# Altium schematic symbol library lib_datalogger.SchLib: 1246 symbols (part 11 of 16)
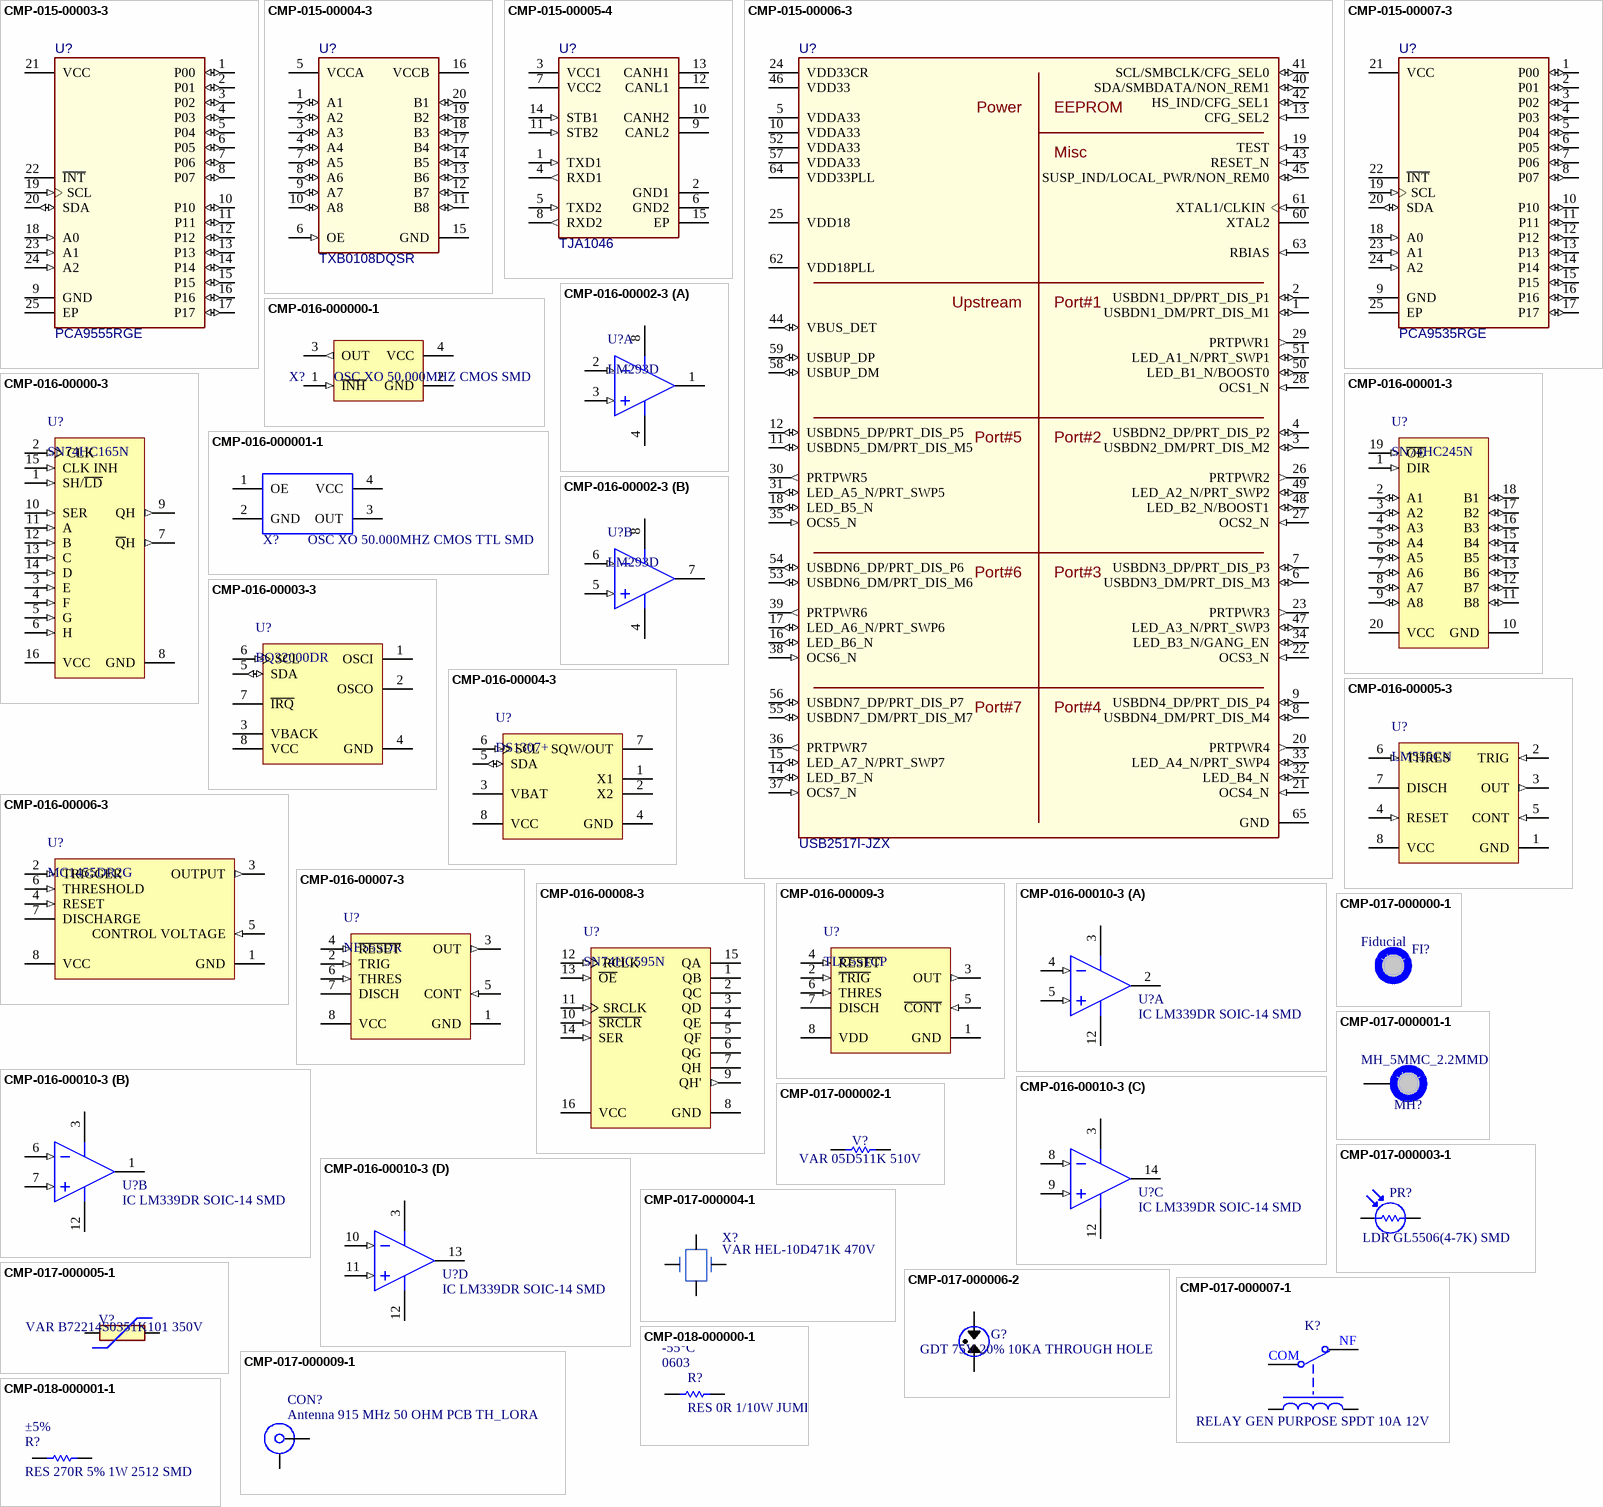
[diagram p53: symbols CMP-015-00003-3 to CMP-018-000001-1]

## CMP-015-00006-3
designator U?, comment USB2517I-JZX
Industrial Temperature Rated USB 2.0 Hi-Speed 7-Port Hub Controller, 3.3 V, -40 to 85 degC, 64-Pin QFN, RoHS, Tube; Case/Package: 64-VFQFNExposedPad; Pins: 65; Mounting Technology: SurfaceMount
footprint MCHP-QFN-64-4700X4700TP (QFN, 64-Leads, Body 9.1x9.1mm, Pitch 0.5mm, Thermal Pad 4.7x4.7mm)
footprint MCHP-QFN-64-4700X4700TP (QFN, 64-Leads, Body 9.1x9.1mm, Pitch 0.5mm, Thermal Pad 4.7x4.7mm)
pins: 1 USBDN1_DM/PRT_DIS_M1 (io), 2 USBDN1_DP/PRT_DIS_P1 (io), 3 USBDN2_DM/PRT_DIS_M2 (io), 4 USBDN2_DP/PRT_DIS_P2 (io), 5 VDDA33 (power) ""VDD Analog I/O.+3.3V Filtered analog PHY power which is shared between", 6 USBDN3_DM/PRT_DIS_M3 (io), 7 USBDN3_DP/PRT_DIS_P3 (io), 8 USBDN4_DM/PRT_DIS_M4 (io), 9 USBDN4_DP/PRT_DIS_P4 (io), 10 VDDA33 (power) ""VDD Analog I/O.+3.3V Filtered analog PHY power which is shared between", 11 USBDN5_DM/PRT_DIS_M5 (io), 12 USBDN5_DP/PRT_DIS_P5 (io), 13 CFG_SEL2 (in) "Configuration Programming Select", 14 LED_B7_N (io) "Enhanced Indicator LED for ports 7", 15 LED_A7_N/PRT_SWP7 (io), 16 LED_B6_N (io) "Enhanced Indicator LED for ports 6", 17 LED_A6_N/PRT_SWP6 (io), 18 LED_B5_N (io) "Enhanced Indicator LED for ports 5", 19 TEST (in) "TEST pin", 20 PRTPWR4 (out) "USB Power Enable", 21 OCS4_N (in) "Over-current Sense", 22 OCS3_N (in) "Over-current Sense", 23 PRTPWR3 (out) "USB Power Enable", 24 VDD33CR (power) ""VDDIO/VDD 3.3 Core Regulator Reference.+3.3V power supply for the Digital I/O. If the internal core", 25 VDD18 (power) ""VDD Core.+1.8V core power. This pin must have a 1.0uF (or greater) +/-20%", 26 PRTPWR2 (out) "USB Power Enable", 27 OCS2_N (in) "Over-current Sense", 28 OCS1_N (in) "Over-current Sense", 29 PRTPWR1 (out) "USB Power Enable", 30 PRTPWR5 (out) "USB Power Enable", 31 LED_A5_N/PRT_SWP5 (io), 32 LED_B4_N (io) "Enhanced Indicator LED for ports 4", 33 LED_A4_N/PRT_SWP4 (io), 34 LED_B3_N/GANG_EN (io), 35 OCS5_N (in) "Over-current Sense", 36 PRTPWR7 (out) "USB Power Enable", 37 OCS7_N (in) "Over-current Sense", 38 OCS6_N (in) "Over-current Sense", 39 PRTPWR6 (out) "USB Power Enable", 40 SDA/SMBDATA/NON_REM1 (io), 41 SCL/SMBCLK/CFG_SEL0 (io), 42 HS_IND/CFG_SEL1 (io), 43 RESET_N (in) "RESET Input", 44 VBUS_DET (io) "Detect Upstream VBUS Power", 45 SUSP_IND/LOCAL_PWR/NON_REM0 (io), 46 VDD33 (power) "VDD I/O.+3.3V Digital I/O power", 47 LED_A3_N/PRT_SWP3 (io), 48 LED_B2_N/BOOST1 (io), 49 LED_A2_N/PRT_SWP2 (io), 50 LED_B1_N/BOOST0 (io), 51 LED_A1_N/PRT_SWP1 (io), 52 VDDA33 (power) ""VDD Analog I/O.+3.3V Filtered analog PHY power which is shared between", 53 USBDN6_DM/PRT_DIS_M6 (io), 54 USBDN6_DP/PRT_DIS_P6 (io), 55 USBDN7_DM/PRT_DIS_M7 (io), 56 USBDN7_DP/PRT_DIS_P7 (io), 57 VDDA33 (power) ""VDD Analog I/O.+3.3V Filtered analog PHY power which is shared between", 58 USBUP_DM (io) "USB Bus Data", 59 USBUP_DP (io) "USB Bus Data", 60 XTAL2 "Crystal Output", 61 XTAL1/CLKIN (in) "Crystal Input/External Clock Input", 62 VDD18PLL (power) ""VDD PLL.+1.8V Filtered analog power for internal PLL. This pin must have", 63 RBIAS (in) "USB Transceiver Bias", 64 VDD33PLL (power) "VDD 3.3 PLL Regulator Reference.+3.3V power supply for the Digital I/O. If the internal PLL 1.8V regulator is enabled, then this pin acts as the regulator input.", 65 GND (power) "Ground"
text: Power; EEPROM; Misc; Upstream; Port#1; Port#5; Port#2; Port#6; Port#3; Port#7; Port#4

## CMP-015-00007-3
designator U?, comment PCA9535RGE
Remote 16-Bit I2C and SMBus I/O Expander with Interrupt Output and Configuration Registers, 2.3 to 5.5 V, -40 to 85 degC, 24-pin VQFN (RGE), Green (RoHS & no Sb/Br); Pins: 25; ComponentLink1Description: Datasheet; ComponentLink2Description: Package Specification; Mounting Technology: Surface Mount; ComponentLink2URL: http://www.ti.com/litv/pdf/mpds211a; ComponentLink1URL: http://www.ti.com/general/docs/lit/getliterature.tsp?genericPartNumber=PCA9535&fileType=pdf
footprint RGE0024C (QFN, 24-Leads, Body 4x4mm, Pitch 0.5mm, Thermal Pad 2.1x2.1mm)
footprint RGE0024C (QFN, 24-Leads, Body 4x4mm, Pitch 0.5mm, Thermal Pad 2.1x2.1mm)
pins: 1 P00 (io) "P-port input/output. Push-pull design structure.", 2 P01 (io) "P-port input/output. Push-pull design structure.", 3 P02 (io) "P-port input/output. Push-pull design structure.", 4 P03 (io) "P-port input/output. Push-pull design structure.", 5 P04 (io) "P-port input/output. Push-pull design structure.", 6 P05 (io) "P-port input/output. Push-pull design structure.", 7 P06 (io) "P-port input/output. Push-pull design structure.", 8 P07 (io) "P-port input/output. Push-pull design structure.", 9 GND (power) "Ground", 10 P10 (io) "P-port input/output. Push-pull design structure.", 11 P11 (io) "P-port input/output. Push-pull design structure.", 12 P12 (io) "P-port input/output. Push-pull design structure.", 13 P13 (io) "P-port input/output. Push-pull design structure.", 14 P14 (io) "P-port input/output. Push-pull design structure.", 15 P15 (io) "P-port input/output. Push-pull design structure.", 16 P16 (io) "P-port input/output. Push-pull design structure.", 17 P17 (io) "P-port input/output. Push-pull design structure.", 18 A0 (in) "Address input 0. Connect directly to VCC or ground.", 19 SCL (in) "Serial clock bus. Connect to VCC through a pullup resistor.", 20 SDA (io) "Serial data bus. Connect to VCC through a pullup resistor.", 21 VCC (power) "Supply voltage", 22 ~{INT} (oc) "Interrupt output. Connect to VCC through a pullup resistor.", 23 A1 (in) "Address input 1. Connect directly to VCC or ground.", 24 A2 (in) "Address input 2. Connect directly to VCC or ground.", 25 EP "Exposed thermal pad"

## CMP-016-000000-1
designator X?, comment OSC XO 50.000MHZ CMOS SMD
Manufacturer: AVX Corp/Kyocera Corp; Part#: KC3225A50.0000C3GE00; MSRP: 0,9145; eVendor: Digi-Key; eVendorPrice: 1,39; eVendor#: 1253-1275-1-ND; MOQ: 1000; Obs: --; Datasheet: http://www.kyocera-crystal.jp/eng/wp-content/uploads/2014/09/kc3225a_c3_e.pdf; Design Item ID: OSC XO 50.000MHZ CMOS SMD; Source: mits.SchLib
footprint 4-SMD 3225
footprint 4-SMD 3225
pins: 1 ~{INH} (in), 2 GND, 3 OUT (out), 4 VCC

## CMP-016-00000-3
designator U?, comment SN74HC165N
Parallel-Load Shift Register, 8-Bit, 2 to 6 V, -40 to 125 degC, 16-Pin PDIP (N), Pb-Free (RoHS), Rail/Tube; Manufacturer: Texas Instruments; Nominal Supply Voltage: 5V; Elements: 1; Propagation Delay: 150ns; Direction: Unidirectional; Min Supply Voltage: 2V; Max Supply Voltage: 6V; Package Version: 4040049/E, 12/2002; Max Ouput Current: 5.2mA; Datasheet URL: http://www.ti.com/lit/ds/symlink/sn74hc165.pdf; Logic Function: ShiftRegister; Package Reference: PDIP-16; Pins: 16; Package Description: 16-Pin Plastic Double In-line Package, Body 19.305 x 6.35 mm, Pitch 2.54 mm; Manufacturer URL: http://www.ti.com/; Min Operating Temperature: -40°C; Packaging: Rail/Tube; Datasheet Version: SCLS116H, 12/2015; Package Quantity: 25; Package URL: http://www.ti.com/lit/ml/mpdi002c/mpdi002c.pdf; RoHS Compliant: True; Mounting Technology: TH; Case/Package: PDIP; Output Current: 5.2mA; Max Operating Temperature: 85°C
footprint TI-N0016A (DIP, 16-Leads, Body 19.7x6.6mm, Pitch 2.54mm)
pins: 1 SH/~{LD} (in), 2 CLK (in), 3 E (in), 4 F (in), 5 G (in), 6 H (in), 7 ~{Q}H (out), 8 GND (power), 9 QH (out), 10 SER (in), 11 A (in), 12 B (in), 13 C (in), 14 D (in), 15 CLK INH (in), 16 VCC (power)

## CMP-016-000001-1
designator X?, comment OSC XO 50.000MHZ CMOS TTL SMD
Manufacturer: Citizen Finedevice Co Ltd; Manufacturer Part Number: CSX-750FJC50000000T; Current - Supply (Disable) (Max): 10µA; Frequency Stability: ±100ppm; Frequency: 50MHz; Current - Supply (Max): 25mA; Voltage - Supply: 3.3V; Function: Standby (Power Down); Size / Dimension: 0.276" L x 0.197" W (7.00mm x 5.00mm); Output: CMOS; Part Status: Active; Type: XO (Standard); Pricing 1: 1=1.98, 10=1.892, 50=1.848, 100=1.584, 500=1.54 (USD); Stock 1: 10225; RoHS: RoHS Compliant; ComponentLink1Description: http://cfd.citizen.co.jp/english/prod-tech/product/pdf/datasheet_Oscillator/CSX-750F_E.pdf; ComponentLink1URL: http://cfd.citizen.co.jp/english/prod-tech/product/pdf/datasheet_Oscillator/CSX-750F_E.pdf; Design Item ID: OSC XO 50.000MHZ CMOS TTL SMD; Source: mits.SchLib; Packaging: Cut Tape (CT); Height - Seated (Max): 0.063" (1.60mm); Package / Case: 4-SMD, No Lead; Mounting Type: Surface Mount; Category: Crystals, Oscillators, Resonators; Operating Temperature: -20°C ~ 70°C; Ratings: -
footprint 4-SMD
footprint 4-SMD
pins: 1 OE, 2 GND, 3 OUT, 4 VCC

## CMP-016-00001-3
designator U?, comment SN74HC245N
Octal Bus Transceiver, 2 to 6 V, -40 to 85 degC, 20-Pin PDIP (N), Pb-Free (RoHS), Tape and Reel; Manufacturer: Texas Instruments; Max Ouput Current: -7.8mA; Output Current: 7.8mA; Min Supply Voltage: 2V; Propagation Delay: 22ns; Elements: 1; Direction: Bidirectional; Channels: 8; Nominal Supply Voltage: 5V; Max Supply Voltage: 6V; Package Description: 20-Pin Double In-line Package, Body 25.4 x 6.35 mm, Pitch 2.54 mm; Mounting Technology: TH; Min Operating Temperature: -40°C; Packaging: Rail/Tube; Case/Package: DIP; Datasheet Version: SCLS131E, 09/2015; Package Quantity: 20; Package URL: http://www.ti.com/lit/ml/mpdi002c/mpdi002c.pdf; Datasheet URL: http://www.ti.com/lit/ds/symlink/sn74hc245.pdf; Max Operating Temperature: 85°C; Manufacturer URL: http://www.ti.com/; Package Reference: N0020A; RoHS Compliant: True; Pins: 20
footprint N0020A (DIP, 20-Leads, Body 26.9x6.6mm, Pitch 2.54mm)
pins: 1 DIR (in) "Direction Pin", 2 A1 (io) "A1 Input/Output", 3 A2 (io) "A2 Input/Output", 4 A3 (io) "A3 Input/Output", 5 A4 (io) "A4 Input/Output", 6 A5 (io) "A5 Input/Output", 7 A6 (io) "A6 Input/Output", 8 A7 (io) "A7 Input/Output", 9 A8 (io) "A8 Input/Output", 10 GND (power) "Ground Pin", 11 B8 (io) "B8 Input/Output", 12 B7 (io) "B7 Input/Output", 13 B6 (io) "B6 Input/Output", 14 B5 (io) "B5 Input/Output", 15 B4 (io) "B4 Input/Output", 16 B3 (io) "B3 Input/Output", 17 B2 (io) "B2 Input/Output", 18 B1 (io) "B1 Input/Output", 19 ~{OE} (in) "Output Enable", 20 VCC (power) "Power Pin"

## CMP-016-00002-3
designator U?, comment LM293D
Dual Differential Comparator, 2 to 30 V, -25 to 85 degC, 8-Pin SOIC (D), Green (RoHS & no Sb/Br), Tube; Manufacturer: Texas Instruments; Min Dual Supply Voltage: 1V; Nominal Voltage Gain: 106.02dB; Elements: 2; Nominal Supply Current: 500µA; Nominal Dual Supply Voltage: 12V; Max Supply Voltage: 30V; Nominal Supply Voltage: 3V; Max Dual Supply Voltage: 18V; Package Version: 4040047-3/M, 06/2011; Min Supply Voltage: 2V; Max Operating Temperature: 85°C; Packaging: Rail/Tube; Case/Package: SOIC; Mounting Technology: SM; Package URL: http://www.ti.com/lit/ml/msoi002j/msoi002j.pdf; Min Operating Temperature: -25°C; RoHS Compliant: True; Package Quantity: 75; Datasheet Version: SLCS005Y, 06/2015; Package Reference: D0008A; Pins: 8; Package Description: 8-Pin Small Outline Integrated Circuit, Body 4.9 x 3.9 mm, Pitch 1.27 mm; Manufacturer URL: http://www.ti.com/; Channels: 2; Datasheet URL: http://www.ti.com/general/docs/lit/getliterature.tsp?genericPartNumber=LM293&fileType=pdf
footprint D0008A_L (SOIC, 8-Leads, Body 5x4mm, Pitch 1.27mm, IPC High Density)
footprint D0008A_N (SOIC, 8-Leads, Body 5x4mm, Pitch 1.27mm, IPC Medium Density)
footprint D0008A_M (SOIC, 8-Leads, Body 5x4mm, Pitch 1.27mm, IPC Low Density)
pins on every part: 4 GND (power) "Ground", 8 VCC (power) "Supply Pin"
part A pins: 1 OUT1 (hiz) "Output pin of comparator 1", 2 IN1- (in) "Negative input pin of comparator 1", 3 IN1+ (in) "Positive input pin of comparator 1"
part B pins: 5 IN2+ (in) "Positive input pin of comparator 2", 6 IN2- (in) "Negative input pin of comparator 2", 7 OUT2 (hiz) "Output pin of comparator 2"

## CMP-016-00003-3
designator U?, comment BQ32000DR
Real-Time Clock (RTC), 3 to 3.6 V, -40 to 85 degC, 8-Pin SOIC (D), Green (RoHS & no Sb/Br), Tape and Reel; Manufacturer: Texas Instruments; Package Version: 4040047-3/M, 06/2011; Max Supply Voltage: 3.6V; Nominal Supply Voltage: 3.3V; Interface: Serial; Min Supply Voltage: 3V; RoHS Compliant: True; Datasheet Version: SLUS900E, 08/2015; Pins: 8; Mounting Technology: SM; Manufacturer URL: http://www.ti.com/; Package Description: 8-Pin Small Outline Integrated Circuit, Body 4.9 x 3.9 mm, Pitch 1.27 mm; Package Quantity: 2500; Datasheet URL: http://www.ti.com/lit/ds/symlink/bq32000.pdf; Package Reference: D0008A; Package URL: http://www.ti.com/lit/ml/msoi002j/msoi002j.pdf; Case/Package: SOIC; Max Operating Temperature: 85°C; Packaging: TapeandReel; Min Operating Temperature: -40°C
footprint D0008A_L (SOIC, 8-Leads, Body 5x4mm, Pitch 1.27mm, IPC High Density)
footprint D0008A_N (SOIC, 8-Leads, Body 5x4mm, Pitch 1.27mm, IPC Medium Density)
footprint D0008A_M (SOIC, 8-Leads, Body 5x4mm, Pitch 1.27mm, IPC Low Density)
pins: 1 OSCI "Oscillator input", 2 OSCO "Oscillator output", 3 VBACK (power) "Backup device power", 4 GND (power) "Ground", 5 SDA (io) "I2C serial data", 6 SCL (in) "I2C serial interface clock", 7 ~{IRQ} (oc) "Configurable interrupt output. Open-drain output.", 8 VCC (power) "Main device power"

## CMP-016-00004-3
designator U?, comment DS1307+
I2C Real-Time Clock, 5 V, 0 to 70 degC, 8-Pin DIP, RoHS, Tube; Manufacturer: Maxim; Min Supply Voltage: 4.5V; Interface: Serial; Nominal Supply Voltage: 5V; Package Version: Rev. E, 04/2011; Max Supply Voltage: 5.5V; RoHS Compliant: True; Manufacturer URL: http://www.maximintegrated.com/; Datasheet Version: Rev. 100208, 10/2008; Datasheet URL: https://datasheet.ciiva.com/20167/82-0567-20167410.pdf; Mounting Technology: TH; Package Quantity: 50; Packaging: Rail/Tube; Package Description: 8-Pin Plastic Dual-In-Line, Narrow (0.3in) (P8-1), Body 9.375 x 6.985 mm, Pitch 2.54 mm; Case/Package: DIP; Min Operating Temperature: 0°C; Package URL: http://pdfserv.maximintegrated.com/package_dwgs/21-0043.PDF; Pins: 8; Max Operating Temperature: 70°C; Package Reference: P8-1
footprint MAXM-P8-1 (DIP, 8-Leads, Body 9.375x6.985mm, Pitch 2.54mm)
pins: 1 X1 "Connections for Standard 32.768kHz Quartz Crystal.", 2 X2 "Connections for Standard 32.768kHz Quartz Crystal.", 3 VBAT (power) "Backup Supply Input for Any Standard 3V Lithium Cell or Other Energy Source.", 4 GND (power) "Ground", 5 SDA (io) "Serial Data Input/Output.", 6 SCL (in) "Serial Clock Input.", 7 SQW/OUT (oc) "Square Wave/Output Driver.", 8 VCC (power) "Primary Power Supply."

## CMP-016-00005-3
designator U?, comment LM555CN
Single Timer, 4.5 to 16 V, 0 to 70 degC, 8-Pin MDIP, RoHS, Rail; Manufacturer: Fairchild Semiconductor; Max Ouput Current: -200mA; Channels: 1; Max Supply Voltage: 16V; Nominal Supply Voltage: 5V; Nominal Supply Current: 7.5mA; Min Supply Voltage: 4.5V; Power: 600mW; Datasheet Version: Rev. 1.1.0, 01/2013; Case/Package: DIP; Max Operating Temperature: 70°C; RoHS Compliant: True; Min Operating Temperature: 0°C; Manufacturer URL: https://www.fairchildsemi.com/; Package Reference: MDIP 8L; Datasheet URL: https://www.fairchildsemi.com/datasheets/LM/LM555.pdf; Pins: 8; Package URL: https://www.fairchildsemi.com/package-drawings/N0/N08E.pdf; Package Description: 8-Pin Dual Inline Package, Body 9.815 x 6.35 mm, Pitch 2.54 mm; Package Quantity: 50; Packaging: Rail/Tube; Mounting Technology: TH
footprint FAIR-MDIP 8L (DIP, 8-Leads, Body 9.4x6.6mm, Pitch 2.54mm)
pins: 1 GND (power), 2 TRIG (in), 3 OUT (out), 4 RESET (in), 5 CONT (in), 6 THRES (in), 7 DISCH (oc), 8 VCC (power)

## CMP-016-00006-3
designator U?, comment MC1455DR2G
Timer, 4.5 to 16 V, 625 mW, 0 to 70 degC, 8-Pin SOIC (751-07), Pb-Free, Tape and Reel; Manufacturer: ON Semiconductor; Max Supply Voltage: 16V; Nominal Supply Current: 10mA; Max Ouput Current: 200mA; Min Supply Voltage: 4.5V; Power: 625mW; Packaging: TapeandReel; Min Operating Temperature: 0°C; RoHS Compliant: True; Pins: 8; Datasheet Version: Rev. 10, 12/2009; Package Quantity: 2500; Datasheet URL: http://www.onsemi.cn/pub_link/Collateral/MC1455-D.PDF; Package URL: http://www.onsemi.com/pub_link/Collateral/NB2304A-D.PDF; Manufacturer URL: http://www.onsemi.com/; Package Reference: SOIC-8-751-07_AJ; Case/Package: SOIC; Package Description: 8-Pin Small Outline Integrated Circuit, Body 4.9 x 3.9 mm, Pitch 1.27 mm; Max Operating Temperature: 70°C; Mounting Technology: SM
footprint ONSC-SOIC-8-751-07_AJ_V (SOIC, 8-Leads, Body 5x4mm, Pitch 1.27mm)
pins: 1 GND (power), 2 TRIGGER (in), 3 OUTPUT (out), 4 RESET (in), 5 CONTROL VOLTAGE (in), 6 THRESHOLD (in), 7 DISCHARGE, 8 VCC (power)

## CMP-016-00007-3
designator U?, comment NE555DR
Precision Timer, 4.5 to 16 V, 0 to 70 degC, 8-Pin SOIC (D), Green (RoHS & no Sb/Br), Tape and Reel; Manufacturer: Texas Instruments; Max Ouput Current: -200mA; Frequency: 100kHz; Max Supply Voltage: 16V; Min Supply Voltage: 4.5V; Package Version: 4040047-3/M, 06/2011; Datasheet Version: SLFS022I, 09/2014; Datasheet URL: http://www.ti.com/general/docs/lit/getliterature.tsp?genericPartNumber=NE555&fileType=pdf; Package Reference: D0008A; Min Operating Temperature: 0°C; Case/Package: SOIC; Pins: 8; RoHS Compliant: True; Packaging: TapeandReel; Package Quantity: 2500; Package URL: http://www.ti.com/lit/ml/msoi002j/msoi002j.pdf; Package Description: 8-Pin Small Outline Integrated Circuit, Body 4.9 x 3.9 mm, Pitch 1.27 mm; Mounting Technology: SM; Max Operating Temperature: 70°C; Manufacturer URL: http://www.ti.com/
footprint D0008A_L (SOIC, 8-Leads, Body 5x4mm, Pitch 1.27mm, IPC High Density)
footprint D0008A_N (SOIC, 8-Leads, Body 5x4mm, Pitch 1.27mm, IPC Medium Density)
footprint D0008A_M (SOIC, 8-Leads, Body 5x4mm, Pitch 1.27mm, IPC Low Density)
pins: 1 GND (power), 2 TRIG (in), 3 OUT (out), 4 ~{RESET} (in), 5 CONT (in), 6 THRES (in), 7 DISCH (oc), 8 VCC (power)

## CMP-016-00008-3
designator U?, comment SN74HC595N
Shift Register, 8-Bit, 2 to 6 V, -40 to 85 degC, 16-Pin PDIP (N), Pb-Free (RoHS), Tube; Manufacturer: Texas Instruments; Propagation Delay: 200ns; Max Ouput Current: 7.8mA; Nominal Supply Voltage: 5V; Max Supply Voltage: 6V; Min Supply Voltage: 2V; Elements: 1; Direction: Unidirectional; Max Operating Temperature: 85°C; Packaging: Rail/Tube; Case/Package: PDIP; Package Quantity: 25; Logic Function: ShiftRegister; RoHS Compliant: True; Min Operating Temperature: -40°C; Datasheet Version: Rev. I, 09/2015; Datasheet URL: http://www.ti.com/lit/ds/symlink/sn74hc595.pdf; Pins: 16; Manufacturer URL: http://www.ti.com/
footprint N0016A (DIP, 16-Leads, Body 19.7x6.6mm, Pitch 2.54mm)
pins: 1 QB (hiz) "QB Output", 2 QC (hiz) "QC Output", 3 QD (hiz) "QD Output", 4 QE (hiz) "QE Output", 5 QF (hiz) "QF Output", 6 QG (hiz) "QG Output", 7 QH (hiz) "QH Output", 8 GND (power) "Ground Pin", 9 QH' (out) "QH' Output", 10 ~{SRCLR} (in) "S\R\C\L\R\ Input", 11 SRCLK (in) "SRCLK Input", 12 RCLK (in) "RCLK Input", 13 ~{OE} (in) "Output Enable Pin", 14 SER (in) "SER Input", 15 QA (hiz) "QA Output", 16 VCC (power) "Power Pin"

## CMP-016-00009-3
designator U?, comment TLC551CP
LinCMOS(TM) Timer, 1.8 MHz, 1 to 15 V, 0 to 70 degC, 8-Pin PDIP (P), Green (RoHS & no Sb/Br), Tube; Manufacturer: Texas Instruments; Nominal Supply Current: 170µA; Package Version: 4040082/E, 04/2010; Max Ouput Current: -10mA; Min Supply Voltage: 1V; Channels: 1; Frequency: 1.8MHz; Max Supply Voltage: 15V; Power: 1W; Pins: 8; RoHS Compliant: True; Packaging: Rail/Tube; Package Reference: P0008A; Datasheet Version: SLFS044B, 09/1997; Package Quantity: 50; Package URL: http://www.ti.com/lit/ml/mpdi001b/mpdi001b.pdf; Case/Package: DIP; Mounting Technology: TH; Max Operating Temperature: 70°C; Package Description: 8-Pin Double In-line Package, Body 9.59 x 6.35 mm, Pitch 2.54 mm; Manufacturer URL: http://www.ti.com/; Datasheet URL: http://www.ti.com/lit/ds/symlink/tlc551.pdf; Min Operating Temperature: 0°C
footprint P0008A (DIP, 8-Leads, Body 10.15x6.6mm, Pitch 2.54mm)
pins: 1 GND (power), 2 ~{TRIG} (in), 3 OUT (out), 4 ~{RESET} (in), 5 ~{CONT} (in), 6 THRES (in), 7 DISCH, 8 VDD (power)

## CMP-016-00010-3
designator U?, comment IC LM339DR SOIC-14 SMD
Comparator Quad R-R O/P ±15V/30V Automotive 14-Pin SOIC T/R; Fornecedor - Sugerido: Digikey; Fabricante - Sugerido: Texas Instruments; Max Supply Current: 500uA; Input Bias Current: 250nA; Min Supply Voltage: 2V; Quiescent Current: 2.5mA; Number of Elements: 4; Output Type: TTL; Voltage Gain: 106.02dB; Input Offset Voltage (Vos): 5mV; Max Supply Voltage: 30V; Output Current per Channel: 6mA; Nominal Supply Current: 2mA; Response Time: 1.3us; Output Current: 20mA; Min Dual Supply Voltage: 1V; Max Dual Supply Voltage: 15V; PartNumber: LM339DR; Observação: --; Packaging: Tape and Reel; Min Operating Temperature: 0°C; Number of Pins: 14; Radiation Hardening: No; Mount: Surface Mount; Package Quantity: 2500; RoHS Compliant: Yes; Max Operating Temperature: 70°C; Lead Free: Lead Free; Weight: 0.004318oz; Contact Plating: Gold; REACH SVHC: No SVHC; Case/Package: SOIC-14; Manufacturer Part Number: LM339DR; Max Input Current: 250nA; Number of Channels: 4
footprint 751A-02_N (SOIC, 14-Leads, Body 8.7x3.9mm, Pitch 1.27mm, IPC Medium Density)
footprint SOIC14
footprint 751A-02_M (SOIC, 14-Leads, Body 8.7x3.9mm, Pitch 1.27mm, IPC Low Density)
3D model 751A-02 (14-Pin Small Outline Integrated Circuit 1.27 mm Pitch)
footprint soic14
footprint FP-D0014A-IPC_B
footprint FP-D0014A-IPC_A
footprint FP-D0014A-IPC_C
pins on every part: 3 V+ (power), 12 GND (power)
part A pins: 2 OUT (oc), 4 IN- (in), 5 IN+ (in)
part B pins: 1 OUT (oc), 6 IN- (in), 7 IN+ (in)
part C pins: 8 IN- (in), 9 IN+ (in), 14 OUT (oc)
part D pins: 10 IN- (in), 11 IN+ (in), 13 OUT (oc)

## CMP-017-000000-1
designator FI?, comment Fiducial  (no BOM)
Design Item ID: Fiducial; Source: mits.SchLib
footprint Fiducial (Fiducial 1.5mm)
footprint Fiducial (Fiducial 1.5mm)

## CMP-017-000001-1
designator MH?, comment MH_5MMC_2.2MMD  (no BOM)
Mounting Hole 5mm Diameter, 2.2mm Drill; Design Item ID: MH_5MMC_2.2MMD; Source: mits.SchLib
footprint MH_5MMD_2.2MMD
footprint MH_5MMD_2.2MMD
pins: 1

## CMP-017-000002-1
designator V?, comment VAR 05D511K 510V
415V 845V 400A 510V THROUGH HOLE VARISTORS ROHS; Manufacturer 1: COV; Source: mits.SchLib; Manufacturer Part Number 1: 05D511K; Design Item ID: VAR 05D511K 510V; Supplier Unit Price 1: 0.027
footprint VAR_TH 5.1/10.2 (Jumper Wire; 2 Leads)
footprint VAR_TH 5.1%2F10.2 (Jumper Wire; 2 Leads)
pins: 1, 2

## CMP-017-000003-1
designator PR?, comment LDR GL5506(4-7K) SMD
THROUGH HOLE PHOTORESISTORS ROHS; Manufacturer 1: JCHL(Shenzhen Jing Chuang He Li Tech); Manufacturer Part Number 1: GL5506(4-7K); Design Item ID: LDR GL5506(4-7K) SMD; Source: mits.SchLib
footprint LDR 3x0.5
footprint LDR 3x0.5
pins: 1, 2

## CMP-017-000004-1
designator X?, comment VAR HEL-10D471K 470V
470V 775V 2.5KA 470V THROUGH HOLE VARISTORS ROHS; Manufacturer 1: Hongzhi Elec; Max Voltage Rating (AC): 470V; Design Item ID: VAR HEL-10D471K 470V; RoHS: Yes; Manufacturer Part Number 1: HEL-10D471K; ComponentLink1Description: 1811081617_Hongzhi-Elec-HEL-10D471K_C111188.pdf; Category: Varistors; ComponentLink1URL: 1811081617_Hongzhi-Elec-HEL-10D471K_C111188.pdf; Varistor Voltage: 775V; Min Operating Temperature: -40°C; Mount: Through Hole; Max Operating Temperature: 85°C; Source: mits.SchLib
footprint 4-SMD 2520
footprint B72214S0351K101
pins: 1, 2, 3, 4

## CMP-017-000005-1
designator V?, comment VAR B72214S0351K101 350V
THROUGH HOLE,P=7.5MM VARISTORS ROHS; Manufacturer Part Number: 05D511K; Manufacturer: COV; ESD Protection: No; Clamping Voltage: 910V; Max Voltage Rating (DC): 460V; Varistor Voltage: 560V; Capacitance: 265pF; Clamping Current: 50A; Energy: 80J; Lead/Base Style: Radial; Packaging: Bulk; ComponentLink1URL: https://datasheet.ciiva.com/6987/siov-leaded-standard-6987287.pdf?src-supplier=Digi-Key; Min Operating Temperature: -40°C; RoHS: Yes; Package Quantity: 250; Max Voltage Rating (AC): 350V; Source: mits.SchLib; Mount: Through Hole; ComponentLink1Description: https://datasheet.ciiva.com/6987/siov-leaded-standard-6987287.pdf?src-supplier=Digi-Key; Category: Varistors; Stock 2: 205; Design Item ID: VAR B72214S0351K101 350V; Max Operating Temperature: 85°C; Pricing 2: 5=0,16940, 50=0,12430, 150=0,11610, 500=0,10790, 2500=0,10420, 5000=0,10240, 5=0,16210, 50=0,11900, 150=0,11120, 500=0,10330, 2500=0,09970, 5000=0,09800, 5=0,84660, 50=0,62130, 150=0,58060, 500=0,53920, 2500=0,52080, 5000=0,51160, 5=0,81530, 50=0,59830, 150=0,55910, 500=0,51930, 2500=0,50160, 5000=0,49270, 5=0,10960, 50=0,08040, 150=0,07520, 500=0,06980, 2500=0,06740, 5000=0,06620, 5=0,09320, 50=0,06840, 150=0,06390, 500=0,05940, 2500=0,05730, 5000=0,05630, 5=1,00230, 50=0,73560, 150=0,68740, 500=0,63840, 2500=0,61660, 5000=0,60580, 5=14,26990, 50=10,47270, 150=9,78640, 500=9,08890, 2500=8,77890, 5000=8,62400, 5=0,53370, 50=0,39170, 150=0,36600, 500=0,33990, 2500=0,32830, 5000=0,32250, 5=9,85260, 50=7,23080, 150=6,75690, 500=6,27540, 2500=6,06140, 5000=5,95430, 5=1,12440, 50=0,82520, 150=0,77110, 500=0,71620, 2500=0,69180, 5000=0,67950, 5=0,17350, 50=0,12730, 150=0,11900, 500=0,11050, 2500=0,10670, 5000=0,10480, 5=0,12890, 50=0,09460, 150=0,08840, 500=0,08210, 2500=0,07930, 5000=0,07790 (AUD); Series: -
footprint B72214S0351K101
footprint B72214S0351K101
pins: 1, 2

## CMP-017-000006-2
designator G?, comment GDT 75V 20% 10KA THROUGH HOLE
Manufacturer: Bourns Inc.; Manufacturer Part Number: 2027-07-BLF; Impulse Discharge Current (8/20µs): 10000A (10kA); Fail Short: No; Number of Poles: 2; Tolerance: ±20%; Category: Circuit Protection; Mounting Type: Through Hole; RoHS: RoHS Compliant; Pricing 1: 1=1.41, 5=1.364, 10=1.276, 50=1.056, 100=0.88, 250=0.858, 500=0.726, 1000=0.638, 5000=0.572 (USD); Packaging: Bulk; ComponentLink1URL: http://www.bourns.com/docs/Product-Datasheets/2027.pdf; Design Item ID: GDT 75V 20% 10KA THROUGH HOLE; Stock 1: 2830; Package / Case: Axial Cylinder; ComponentLink1Description: http://www.bourns.com/docs/Product-Datasheets/2027.pdf; Voltage - DC Spark Over (Nom): 75V; Part Status: Active; Source: mits.SchLib
footprint GDT_AXIAL_TH
footprint GDT_AXIAL_TH
pins: 1, 2

## CMP-017-000007-1
designator K?, comment RELAY GEN PURPOSE SPDT 10A 12V
General Purpose Non Latching 12VDC SPST-NC Through Hole Relays RoHS; Manufacturer Part Number: SRD-12VDC-SL-B; Manufacturer: Ningbo Songle Relay; Mounting Type: Through Hole; ComponentLink1URL: https://datasheet.lcsc.com/lcsc/1810010621_Ningbo-Songle-Relay-SRD-12VDC-SL-B_C185800.pdf; ComponentLink1Description: https://datasheet.lcsc.com/lcsc/1810010621_Ningbo-Songle-Relay-SRD-12VDC-SL-B_C185800.pdf; Coil Voltage: 12VDC; Contact Form: SPST-NC; Contact Rating (Current): 10A; Relay Type: General Purpose; Source: mits.SchLib; Coil Type: Non Latching; Category: Relays; Design Item ID: RELAY GEN PURPOSE SPDT 10A 12V; RoHS: RoHS Compliant
footprint Relay-NF (NF Relay Footprint)
footprint Relay-NF (NF Relay Footprint)
pins: 1, 2, 3 COMUM, 4 NF
text: COM

## CMP-017-000009-1
designator CON?, comment Antenna 915 MHz 50 OHM PCB TH_LORA
Antennas 915 MHz Monopole Helical Antenna, Internal/Embedded Through-Hole Mount, Solder; Manufacturer Part Number: ANT-915-VHETH; Manufacturer: Linx Technologies; Design Item ID: Antenna 915 MHz 50 OHM PCB TH_LORA; RoHS: Yes; Source: mits.SchLib
footprint CON-SMA-TH_5-1814832-2-LORA - RIGHT - ANGLE
footprint CON-SMA-TH_5-1814832-2-LORA
pins: 1 "PAD", 2 "PAD"

## CMP-018-000000-1
designator R?, comment RES 0R 1/10W JUMP 0603  Case/Package: 0603  Min Operating Temperature: -55°C  Resistance: 0mR  Max Operating Temperature: 155°C  Manufacturer: Uniroyal  RoHS Compliant: Yes  Packaging: Tape and Reel  Voltage Rating: 50V  Package Quantity: 5000  Tolerance: 1%
YAGEO - RC0603JR-070RL - Chipwiderstand, Oberflächenmontage, Jumper, 0603 [Metrisch 1608], 0 ohm, Baureihe RC, 75 V, Dickschicht; Manufacturer Part Number: 0603WAF0000T5E; Max Power Dissipation: 100mW; Temperature Coefficient: 200ppm/°C; Resistance Tolerance: 5%; Pricing 1: 1=0,10000, 10=0,01700, 25=0,01240, 50=0,00940, 100=0,00700, 250=0,00532, 500=0,00424, 1000=0,00313 (USD); Radiation Hardening: No; Category: Chip SMD Resistors; Depth: 0.8mm; ComponentLink2Description: https://datasheet.ciiva.com/8883/pyu-rc0603-51-rohs-l-4-8883045.pdf?src-supplier=Avnet; Number of Terminations: 2; Case Code (Metric): 1608; Number of Pins: 2; Stock 1: 1649957; Contact Plating: Tin,Matte; ComponentLink5Description: https://datasheet.ciiva.com/15189/getdatasheetpartid-329462-15189845.pdf?src-supplier=Verical; Case Code (Imperial): 0603; Resistor Type: Thick Film; ComponentLink1URL: https://datasheet.ciiva.com/11808/pyu-r-int-6-11808700.pdf?src-supplier=RSComponents; Series: RC; ComponentLink7Description: https://datasheet.ciiva.com/7746/1738695-7746422.pdf?src-supplier=Element14; Features: Moisture Resistant; ComponentLink4Description: https://datasheet.ciiva.com/22747/443971-22747530.pdf?src-supplier=Element14; Military Standard: Not; Voltage Rating (DC): 50V; Termination: SMD/SMT; REACH SVHC: No SVHC; ComponentLink1Description: https://datasheet.ciiva.com/11808/pyu-r-int-6-11808700.pdf?src-supplier=RSComponents; Design Item ID: RES 0R 1/10W JUMP 0603; Construction: Rectangular; Size Code: 0603; ComponentLink5URL: https://datasheet.ciiva.com/15189/getdatasheetpartid-329462-15189845.pdf?src-supplier=Verical; Width: 0.8mm; ComponentLink6Description: https://datasheet.ciiva.com/7746/1738695-7746421.pdf?src-supplier=Element14; ComponentLink2URL: https://datasheet.ciiva.com/8883/pyu-rc0603-51-rohs-l-4-8883045.pdf?src-supplier=Avnet; ComponentLink7URL: https://datasheet.ciiva.com/7746/1738695-7746422.pdf?src-supplier=Element14; ComponentLink4URL: https://datasheet.ciiva.com/22747/443971-22747530.pdf?src-supplier=Element14; Height: 0.45mm; Lead Free: Lead Free; RoHS: Yes; Source: mits.SchLib; ComponentLink6URL: https://datasheet.ciiva.com/7746/1738695-7746421.pdf?src-supplier=Element14; Power Rating: 100mW; Length: 1.6mm; ComponentLink3URL: https://datasheet.ciiva.com/12555/rc0603-272842-12555254.pdf?src-supplier=Mouser; Technology: THICK FILM; ComponentLink3Description: https://datasheet.ciiva.com/12555/rc0603-272842-12555254.pdf?src-supplier=Mouser
footprint CR3216-1206 (Chip Capacitor; Body 3.2 x 1.6 mm (LxW typ))
footprint CR1608-0603 (Chip Resistor; Body 1.6 x 0.8 mm (LxW typ))
pins: 1, 2

## CMP-018-000001-1
designator R?, comment RES 270R 5% 1W 2512 SMD  Tolerance: ±5%
RES SMD 270 OHM 5% 1W 2512; Manufacturer 1: Royal Electronic Factory; Manufacturer Part Number 1: 25121WJ0271T4E; Resistance (Ohms): 270; Supplier Device Package: 2512; Package / Case: 2512; Part Status: Active; RoHS: RoHS Compliant; ComponentLink1URL: http://industrial.panasonic.com/www-cgi/jvcr13pz.cgi?E+PZ+3+AOA0001+ERJ8GEYJ271V+7+WW; Number of Terminations: 2; Category: Resistors; ComponentLink1Description: http://industrial.panasonic.com/www-cgi/jvcr13pz.cgi?E+PZ+3+AOA0001+ERJ8GEYJ271V+7+WW; Design Item ID: RES 270R 5% 1W 2512 SMD; Power (Watts): 1W; Source: mits.SchLib
footprint CR1608-0603 (Chip Resistor; Body 1.6 x 0.8 mm (LxW typ))
footprint CR6432-2512 (Chip Resistor, 2-Leads, Body 6,35x3,20mm, IPC Medium Density)
pins: 1, 2

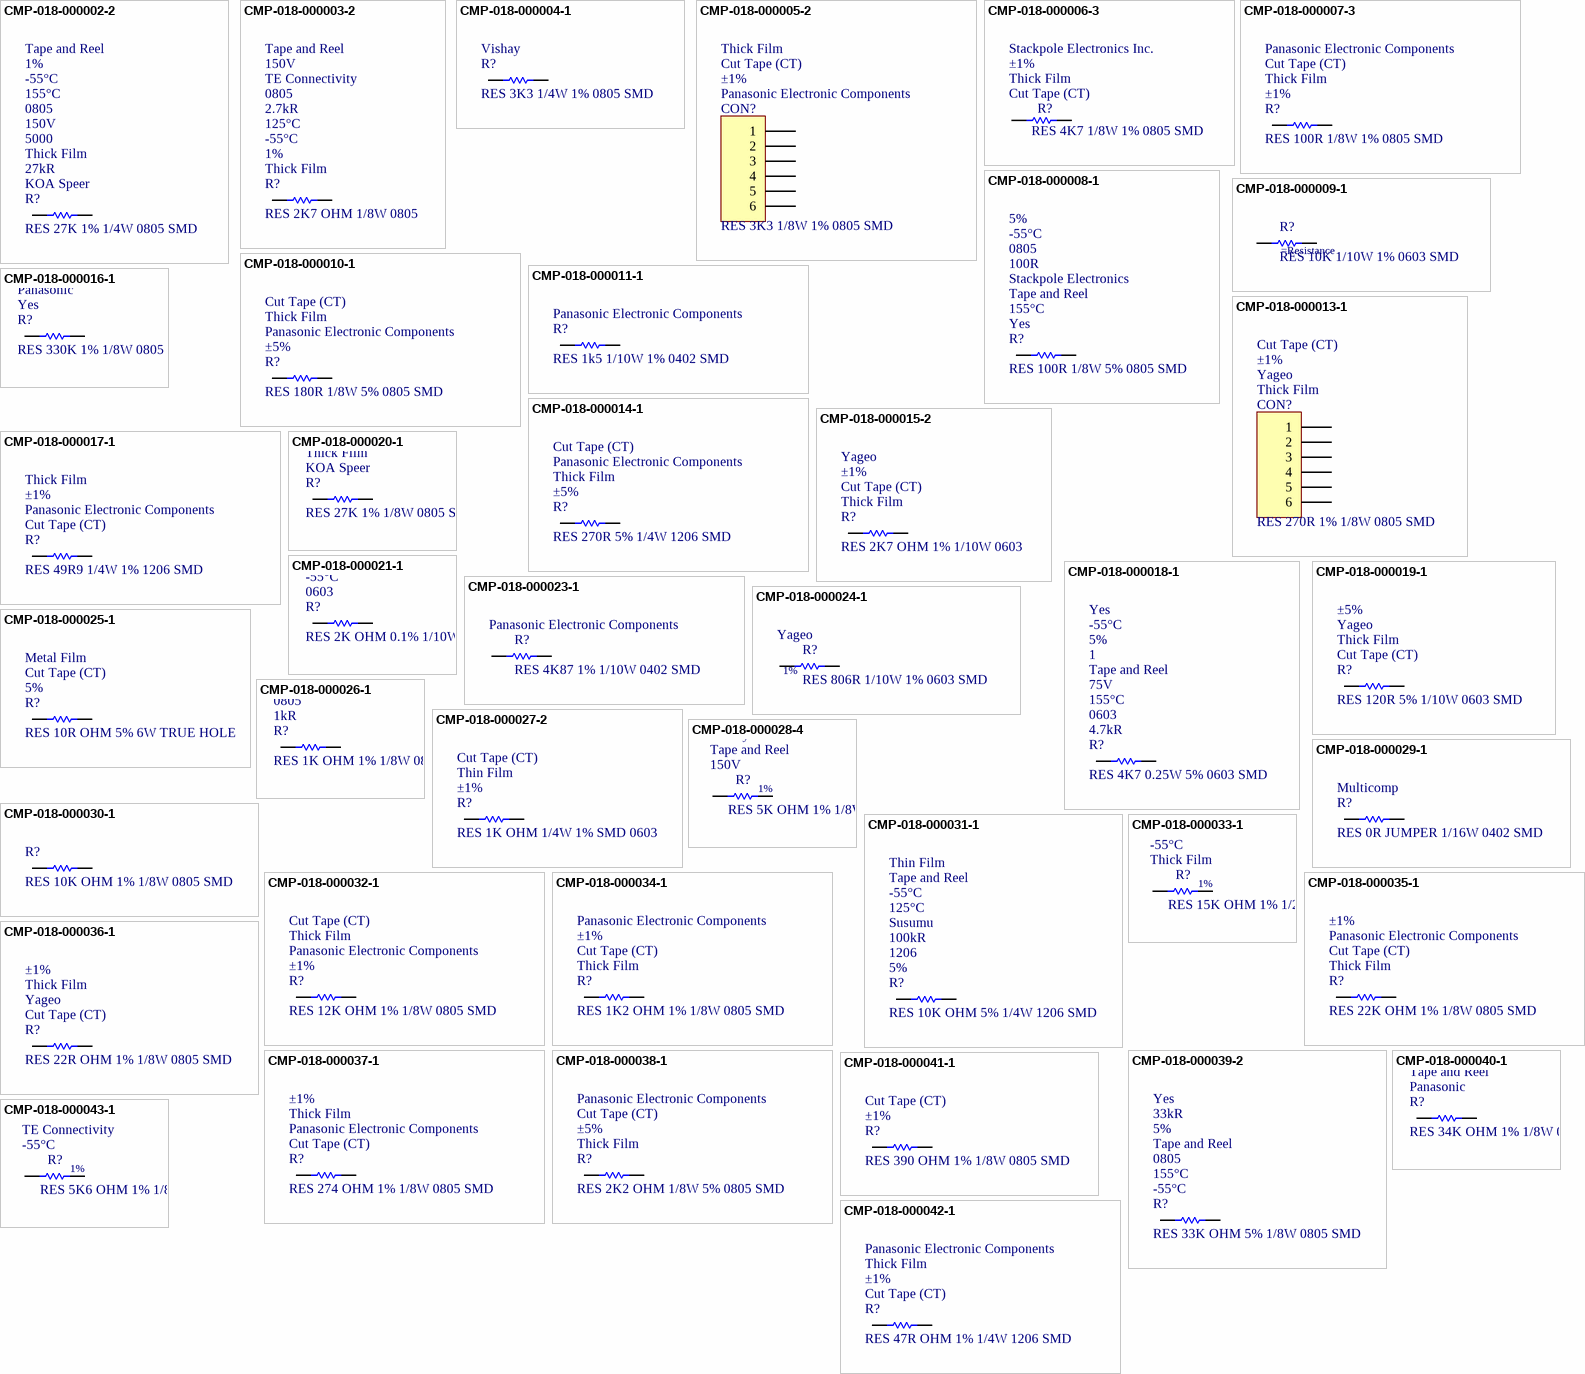
[diagram p32: symbols CMP-018-000002-2 to CMP-018-000043-1]

## CMP-018-000002-2
designator R?, comment RES 27K 1% 1/4W 0805 SMD  Manufacturer: KOA Speer  Resistance: 27kR  Composition: Thick Film  Package Quantity: 5000  Voltage Rating: 150V  Case/Package: 0805  Max Operating Temperature: 155°C  Min Operating Temperature: -55°C  Tolerance: 1%  Packaging: Tape and Reel
RES SMD 27K OHM 1% 1/4W 0805; Manufacturer Part Number: RK73H2ATTD2702F; Temperature Coefficient: 100ppm/°C; Power Rating: 125mW; Design Item ID: RES 27K 1% 1/4W 0805 SMD; Military Standard: Not; Stock 1: 25750; Category: Chip SMD Resistors; Number of Pins: 2; Height: 0.5mm; ComponentLink1Description: http://www.yageo.com/documents/recent/PYu-RC_Group_51_RoHS_L_04.pdf; Lead Free: Lead Free; Source: mits.SchLib; Length: 2mm; ComponentLink1URL: http://www.yageo.com/documents/recent/PYu-RC_Group_51_RoHS_L_04.pdf; Termination: SMD/SMT; Case Code (Imperial): 0805; RoHS: Yes; Pricing 1: 1=0,10000, 10=0,03300, 100=0,01360, 1000=0,00612, 2500=0,00531 (USD); Width: 1.25mm; Depth: 1.25mm; ComponentLink2Description: https://datasheet.ciiva.com/7866/549017-7866749.pdf?src-supplier=Element14; Case Code (Metric): 2012; ComponentLink2URL: https://datasheet.ciiva.com/7866/549017-7866749.pdf?src-supplier=Element14
footprint CR1608-0603 (Chip Resistor; Body 1.6 x 0.8 mm (LxW typ))
footprint CR2012-0805 (Chip Capacitor)
pins: 1, 2

## CMP-018-000003-2
designator R?, comment RES 2K7 OHM 1/8W 0805  Composition: Thick Film  Tolerance: 1%  Min Operating Temperature: -55°C  Max Operating Temperature: 125°C  Resistance: 2.7kR  Case/Package: 0805  Manufacturer: TE Connectivity  Voltage Rating: 150V  Packaging: Tape and Reel
RES SMD 2.7K OHM 1/8W 0805; Manufacturer Part Number: CRG0805F2K7; Temperature Coefficient: 100ppm/°C; Number of Resistors: 1; Power Rating: 125mW; ComponentLink4Description: https://datasheet.ciiva.com/12562/eng-ds-1773204-g-12562348.pdf?src-supplier=Mouser; Depth: 1.25mm; RoHS: Yes; Design Item ID: RES 2K7 OHM 1% 1/8W 0805; Radiation Hardening: No; Pricing 1: 1=0,10000, 10=0,04900, 100=0,02000, 1000=0,00898, 2500=0,00780 (USD); ComponentLink2Description: https://datasheet.ciiva.com/11810/0900766b800a696e-11810661.pdf?src-supplier=RSComponents; ComponentLink4URL: https://datasheet.ciiva.com/12562/eng-ds-1773204-g-12562348.pdf?src-supplier=Mouser; Number of Terminations: 2; Category: Chip SMD Resistors; ComponentLink3Description: https://datasheet.ciiva.com/16771/70063020-16771142.pdf?src-supplier=Allied+Electronics; ComponentLink2URL: https://datasheet.ciiva.com/11810/0900766b800a696e-11810661.pdf?src-supplier=RSComponents; ELV: Compliant; Height: 0.55mm; Source: mits.SchLib; Length: 2mm; Stock 1: 341448; Width: 1.25mm; Termination: Solder; Case Code (Imperial): 0805; Case Code (Metric): 2012; ComponentLink1Description: http://www.yageo.com/NewPortal/yageodocoutput?fileName=/pdf/R-Chip/PYu-RC_Group_51_RoHS_L_4.pdf; Mount: Surface Mount; ComponentLink1URL: http://www.yageo.com/NewPortal/yageodocoutput?fileName=/pdf/R-Chip/PYu-RC_Group_51_RoHS_L_4.pdf; ComponentLink3URL: https://datasheet.ciiva.com/16771/70063020-16771142.pdf?src-supplier=Allied+Electronics
footprint CR1608-0603 (Chip Resistor; Body 1.6 x 0.8 mm (LxW typ))
footprint CR2012-0805 (Chip Capacitor)
pins: 1, 2

## CMP-018-000004-1
designator R?, comment RES 3K3 1/4W 1% 0805 SMD  Manufacturer: Vishay
3.3 kOhms ±1% 0.25W, 1/4W Chip Resistor 0805; Manufacturer Part Number: RCC08053K30FKEA; Category: Chip SMD Resistors; RoHS: Yes; Pricing 1: 1=0,19000, 10=0,16100, 100=0,06280, 1000=0,02629, 2500=0,02410 (USD); Stock 1: 8323; Design Item ID: RES 3K3 1/4W 1% 0805 SMD; Source: mits.SchLib
footprint CR1608-0603 (Chip Resistor; Body 1.6 x 0.8 mm (LxW typ))
footprint CR2012-0805 (Chip Capacitor)
pins: 1, 2

## CMP-018-000005-2
designator CON?, comment RES 3K3 1/8W 1% 0805 SMD  Manufacturer: Panasonic Electronic Components  Tolerance: ±1%  Packaging: Cut Tape (CT)  Composition: Thick Film
RES 3.3K OHM 1/8W 1% 0805 SMD; Manufacturer Part Number: ERJ-6ENF3301V; Power (Watts): 0.125W, 1/8W; Temperature Coefficient: ±100ppm/°C; Features: Automotive AEC-Q200; Category: Resistors; Operating Temperature: -55°C ~ 155°C; Resistance (Ohms): 3.3k; Failure Rate: -; Pricing 1: 1=0.1, 10=0.036, 25=0.0264, 50=0.02, 100=0.0148, 250=0.01124, 500=0.009, 1000=0.00663 (USD); RoHS: RoHS Compliant; Part Status: Active; Stock 1: 31953; Source: mits.SchLib; ComponentLink1URL: https://industrial.panasonic.com/cdbs/www-data/pdf/RDA0000/AOA0000C283.pdf; Package / Case: 0805 (2012 Metric); Design Item ID: RES 3K3 1/8W 1% 0805 SMD; Height - Seated (Max): 0.028" (0.70mm); Size / Dimension: 0.079" L x 0.049" W (2.00mm x 1.25mm); Supplier Device Package: 0805; ComponentLink1Description: https://industrial.panasonic.com/cdbs/www-data/pdf/RDA0000/AOA0000C283.pdf
footprint CR2012-0805 (Chip Capacitor)
pins: 1, 2, 3, 4, 5, 6

## CMP-018-000006-3
designator R?, comment RES 4K7 1/8W 1% 0805 SMD  Packaging: Cut Tape (CT)  Composition: Thick Film  Tolerance: ±1%  Manufacturer: Stackpole Electronics Inc.
RES SMD 4.7K OHM 1% 1/8W 0805; Manufacturer Part Number: RMCF0805FT4K70; Temperature Coefficient: ±100ppm/°C; Power (Watts): 0.125W, 1/8W; Height: 0.026" (0.65mm); RoHS: RoHS Compliant; Source: mits.SchLib; Part Status: Active; Design Item ID: RES 4K7 1/8W 1% 0805 SMD; Supplier Device Package: 0805; Stock 1: 62180; Size / Dimension: 0.079" L x 0.049" W (2.00mm x 1.25mm); Pricing 1: 1=0.1, 10=0.023, 50=0.0128, 100=0.0095, 250=0.00724, 500=0.00578, 1000=0.00426, 2500=0.00369 (USD); Features: Automotive AEC-Q200; Operating Temperature: -55°C ~ 155°C; Resistance (Ohms): 4.7k; Number of Terminations: 2; ComponentLink1URL: https://www.seielect.com/Catalog/SEI-RMCF_RMCP.pdf; ComponentLink1Description: https://www.seielect.com/Catalog/SEI-RMCF_RMCP.pdf; Category: Resistors; Failure Rate: -; Package / Case: 0805 (2012 Metric)
footprint CR1608-0603 (Chip Resistor; Body 1.6 x 0.8 mm (LxW typ))
footprint CR2012-0805 (Chip Capacitor)
pins: 1, 2

## CMP-018-000007-3
designator R?, comment RES 100R 1/8W 1% 0805 SMD  Tolerance: ±1%  Composition: Thick Film  Packaging: Cut Tape (CT)  Manufacturer: Panasonic Electronic Components
RES SMD 100 OHM 1% 1/8W 0805; Manufacturer Part Number: ERJ-6ENF1000V; Resistance (Ohms): 100; Power (Watts): 0.125W, 1/8W; Temperature Coefficient: ±100ppm/°C; Number of Terminations: 2; Failure Rate: -; ComponentLink1URL: http://industrial.panasonic.com/www-cgi/jvcr13pz.cgi?E+PZ+3+AOA0002+ERJ6ENF1000V+7+WW; Features: Automotive AEC-Q200; Pricing 1: 1=0.1, 50=0.022, 100=0.0162, 250=0.01236, 500=0.0099, 1000=0.00729 (USD); RoHS: RoHS Compliant; Package / Case: 0805 (2012 Metric); Height: 0.028" (0.70mm); Part Status: Active; ComponentLink1Description: http://industrial.panasonic.com/www-cgi/jvcr13pz.cgi?E+PZ+3+AOA0002+ERJ6ENF1000V+7+WW; Operating Temperature: -55°C ~ 155°C; Supplier Device Package: 0805; Size / Dimension: 0.079" L x 0.049" W (2.00mm x 1.25mm); Stock 1: 816047; Design Item ID: RES 100R 1/8W 1% 0805 SMD; Source: mits.SchLib; Category: Resistors
footprint CR1608-0603 (Chip Resistor; Body 1.6 x 0.8 mm (LxW typ))
footprint CR2012-0805 (Chip Capacitor)
pins: 1, 2

## CMP-018-000008-1
designator R?, comment RES 100R 1/8W 5% 0805 SMD  RoHS Compliant: Yes  Max Operating Temperature: 155°C  Packaging: Tape and Reel  Manufacturer: Stackpole Electronics  Resistance: 100R  Case/Package: 0805  Min Operating Temperature: -55°C  Tolerance: 5%
RES 100 OHM 5% 1/8W 0805; Manufacturer Part Number: RMCF0805JT100R; Temperature Coefficient: 200ppm/°C; Max Power Dissipation: 125mW; Source: mits.SchLib; Case Code (Metric): 2012; ComponentLink1URL: https://datasheet.ciiva.com/15193/getdatasheetpartid-371022-15193626.pdf?src-supplier=Verical; Number of Terminations: 2; Width: 0.049inch; Depth: 1.25mm; Height: 0.026inch; Mount: Surface Mount; Length: 2mm; Case Code (Imperial): 0805; Lead Free: Lead Free; Series: RMCF; Contact Plating: Tin,Matte; Pricing 1: 1=0,10000, 10=0,02000, 100=0,00810, 1000=0,00366, 2500=0,00318 (USD); Design Item ID: RES 100R 1/8W 5% 0805 SMD; Radiation Hardening: No; Construction: Rectangular; Military Standard: Not; Category: Chip SMD Resistors; ComponentLink1Description: https://datasheet.ciiva.com/15193/getdatasheetpartid-371022-15193626.pdf?src-supplier=Verical; Stock 1: 444705; RoHS: Yes; Features: Automotive AEC-Q200; Resistor Type: Thick Film
footprint CR1608-0603 (Chip Resistor; Body 1.6 x 0.8 mm (LxW typ))
footprint CR2012-0805 (Chip Capacitor)
pins: 1, 2

## CMP-018-000009-1
designator R?, comment RES 10K 1/10W 1% 0603 SMD
RES 10K OHM 1/10W 1% 0603 SMD; Manufacturer Part Number: RC0603FR-0710KL; Manufacturer: Yageo; Temperature Coefficient: ±100ppm/°C; Power (Watts): 0.1W, 1/10W; RoHS: RoHS Compliant; Resistance (Ohms): 10k; Pricing 1: 1=0.1, 10=0.013, 25=0.0092, 50=0.007, 100=0.0052, 250=0.00396, 500=0.00316, 1000=0.00233 (USD); Category: Resistors; Package / Case: 0603 (1608 Metric); Part Status: Active; Size / Dimension: 0.063" L x 0.031" W (1.60mm x 0.80mm); Supplier Device Package: 0603; Features: Moisture Resistant; Design Item ID: RES 10K 1/10W 1% 0603 SMD; Stock 1: 17789030; Source: mits.SchLib; Failure Rate: -; ComponentLink1Description: http://www.yageo.com/documents/recent/PYu-RC_Group_51_RoHS_L_7.pdf; Height - Seated (Max): 0.022" (0.55mm); ComponentLink1URL: http://www.yageo.com/documents/recent/PYu-RC_Group_51_RoHS_L_7.pdf; Operating Temperature: -55°C ~ 155°C; Tolerance: ±1%; Packaging: Cut Tape (CT); Composition: Thick Film
footprint CR1608-0603 (Chip Resistor; Body 1.6 x 0.8 mm (LxW typ))
pins: 1, 2

## CMP-018-000010-1
designator R?, comment RES 180R 1/8W 5% 0805 SMD  Tolerance: ±5%  Manufacturer: Panasonic Electronic Components  Composition: Thick Film  Packaging: Cut Tape (CT)